# Altium footprint library microbuilder.PCBLIB: 422 footprints (part 19 of 27)
Each footprint in its own frame and in the unit in brackets; x right, y up, seen from the top. Pads: shape width x height; smd on the part's side, far side on the other; paste and mask are expansions set on the pad; w line width, h text height; cw(c..) or ccw(c..) is an arc to the next point about the centre after c.
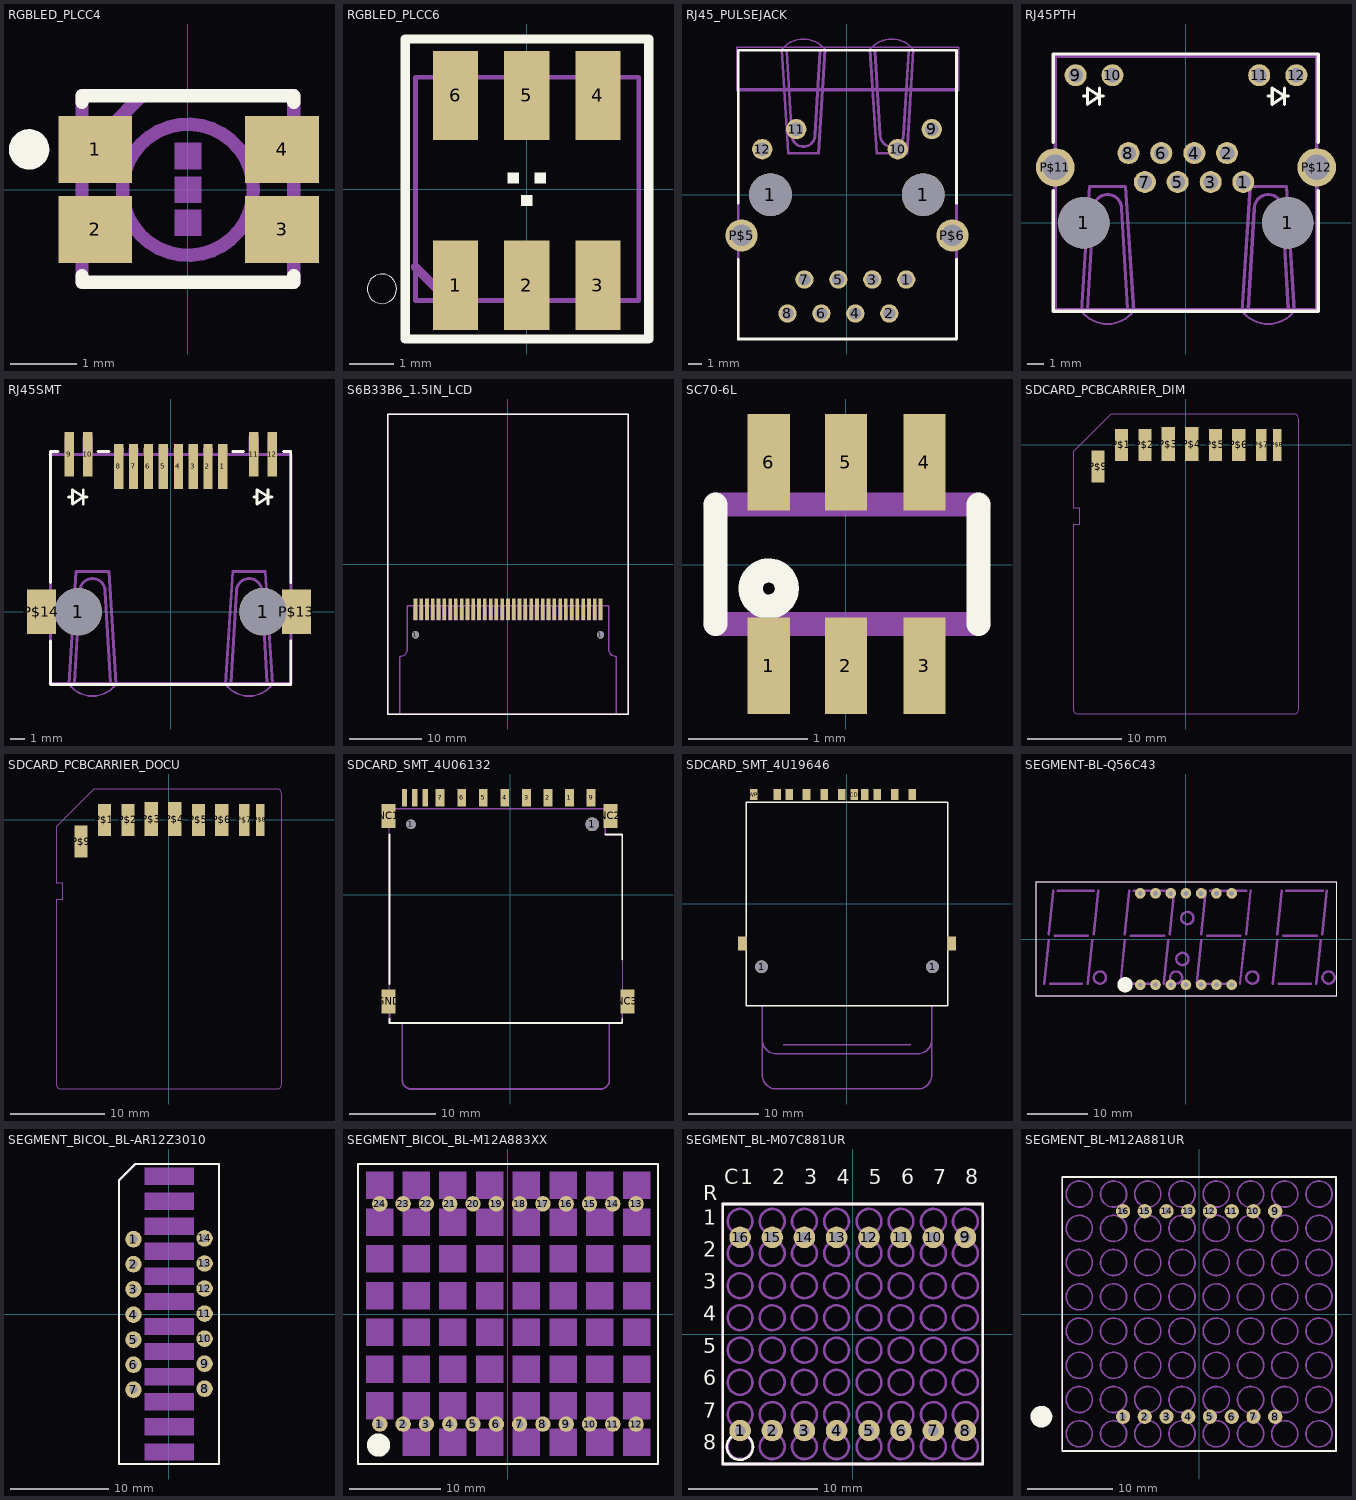
[diagram p18: the footprints below, top view; thin cyan lines are the x and y axes]

## RGBLED_PLCC4 [mil]
pads (4):
  rect 44x40 smd: 1(-55.12,24) 2(-55.12,-23.62) 3(56,-23.62) 4(56,24)
Top Overlay:
  circle w12: c-94.49,24 r6
  lines w8: -62.99,-51.18 -62.99,-55.12 63,-55.12 63,-51.18 ; -62.99,52 -62.99,56 63,56 63,52
Mechanical 16:
  circle w8: c0,0 r39
  rectangle: -7.87,-27.56 8,-11.81
  rectangle: -7.87,-7.87 8,8
  rectangle: -7.87,12 8,28
  lines w5: -62.99,-55.12 63,-55.12 ; -62.99,56 -27.56,56 63,56
  lines w8: -62.99,-55.12 -62.99,20 ; -62.99,56 -62.99,20 ; -27.56,56 -62.99,20 ; 63,-55.12 63,56

## RGBLED_PLCC6 [mil]
pads (6):
  rect 40x79 smd: 1(-62.99,-84.96) 2(0,-84.96) 3(63,-84.96) 4(63,83) 5(0,83) 6(-62.99,83)
Top Overlay:
  circle w0: c-128.11,-88.11 r13
  region: 4.96,-14.8 4.96,-4.88 -4.88,-4.88 -4.88,-14.8
  region: -6.81,5.08 -6.81,14.92 -16.81,14.92 -16.81,5.08
  region: 17,5 17,15 7,15 7,5
  lines w8: -107.5,-132.5 108,-132.5 108,133 -107.5,133 -107.5,-132.5
Top Paste:
  rectangle: 28,-89.57 56,-29.53
  rectangle: -9.84,-89.57 10,-29.53
  rectangle: -55.12,-89.57 -27.56,-29.53
  rectangle: 28,30 56,90
  rectangle: -9.84,30 10,90
  rectangle: -55.12,30 -27.56,90
Top Solder:
  circle w0: c-128.11,-88.11 r13
Mechanical 16:
  lines w4: -98.43,-98.43 -68.9,-98.43 99,-98.43 99,99 -98.43,99 -98.43,-98.43
  lines w8: -98.43,-68.9 -68.9,-98.43

## RJ45_PULSEJACK [mil]
pads (16):
  round 126 hole 126: 1(-225,0) 1(225,0)
  round 54 hole 36: 1(175,-250) 2(125,-350) 3(75,-250) 4(25,-350) 5(-25,-250) 6(-75,-350) 7(-125,-250) 8(-175,-350)
  round 60 hole 40: 9(250,193) 10(150,134) 11(-149.02,193) 12(-249.02,134)
  round 94.5 hole 63: P$5(-310.04,-120.08) P$6(311,-120.08)
Top Overlay:
  lines w8: -320.08,-190.16 -320.08,-425.2 323,-425.2 323,-190.16 ; -320.08,-25.2 -320.08,310 -320.08,425 323,425 323,310 323,-25.2
Mechanical 16:
  lines w5: -320.08,-425.2 323,-425.2 ; -320.08,310 -320.08,425 323,425 323,310 ; -192.05,427 cw(c-128.07,377.79) -64.09,427 ; 68,427 cw(c132,377.77) 196,427
  lines w8: -320.08,-425.2 -320.08,310 323,310 323,-425.2 ; -192.05,427 -172.36,122 -83.78,122 -64.09,427 ; -177.28,422 -162.52,176 ccw(c-128.07,176) -93.62,176 -78.86,422 ; 68,427 88,122 177,122 196,427 ; 83,422 98,176 ccw(c132.5,176) 167,176 182,422
  text "NO TRACE ZONE" at -230,350 h62
Mechanical 27:
  lines w5: -324.65,306 330,306 330,434 -324.65,434 -324.65,306

## RJ45PTH [mil]
pads (16):
  round 126 hole 126: 1(-250,0) 1(250,0)
  round 54 hole 36: 1(141,100) 2(101,171) 3(61,100) 4(21,171) 5(-20.08,100) 6(-60.24,171) 7(-100.39,100) 8(-140.55,171) 9(-270.08,362) 10(-179.92,362) 11(180,362) 12(271,362)
  round 94.5 hole 63: P$11(-320.08,136) P$12(321,136)
Top Overlay:
  lines w8: -324.8,79 -324.8,-216.54 325,-216.54 325,79 ; -324.8,197 -324.8,414 325,414 325,197 ; -250.98,311 -241.14,311 ; -211.61,291 -211.61,311 ; -211.61,330 -211.61,311 ; -201.77,311 -211.61,311 ; 202,311 212,311 ; 242,291 242,311 ; 242,330 242,311 ; 251,311 242,311 ; -241.14,311 -241.14,330 -211.61,311 ; -241.14,311 -241.14,291 -211.61,311 ; 212,311 212,330 242,311 ; 212,311 212,291 242,311
Mechanical 16:
  lines w5: -255.91,-216.54 ccw(c-191.93,-167.32) -127.95,-216.54 ; 138,-216.54 ccw(c202,-167.3) 266,-216.54
  lines w8: -255.91,-216.54 -236.22,89 -147.64,89 -127.95,-216.54 ; -241.14,-211.61 -226.38,35 cw(c-191.93,35) -157.48,35 -142.72,-211.61 ; 138,-216.54 158,89 247,89 266,-216.54 ; 153,-211.61 168,35 cw(c202.5,35) 237,35 251,-211.61 ; -320.08,-212.6 321,-212.6 321,408 -320.08,408 -320.08,-212.6

## RJ45SMT [mil]
pads (16):
  round 128 hole 128: 1(-250,0) 1(250,0)
  rect 25x121 smd: 1(141,393) 2(101,393) 3(61,393) 4(21,393) 5(-20.08,393) 6(-60.24,393) 7(-100.39,393) 8(-140.55,393) 9(-274.61,426) 10(-224.61,426) 11(225,426) 12(275,426)
  rect 79x121 smd: P$13(341,0) P$14(-350,0)
Top Overlay:
  lines w8: -324.8,-78.74 -324.8,-196.85 325,-196.85 325,-78.74 ; -324.8,79 -324.8,434 -305.12,434 ; -275.98,311 -266.14,311 ; -236.61,291 -236.61,311 ; -236.61,330 -236.61,311 ; -226.77,311 -236.61,311 ; -196.85,434 -167.32,434 ; 168,434 197,434 ; 225,311 234,311 ; 264,291 264,311 ; 264,330 264,311 ; 274,311 264,311 ; 306,434 325,434 325,79 ; -266.14,311 -266.14,330 -236.61,311 ; -266.14,311 -266.14,291 -236.61,311 ; 234,311 234,330 264,311 ; 234,311 234,291 264,311
Mechanical 16:
  lines w5: -275.59,-196.85 ccw(c-211.61,-147.64) -147.64,-196.85 ; 148,-196.85 ccw(c212,-147.62) 276,-196.85 ; 215,469 215,471
  lines w8: -329.72,-49.21 -369.09,-49.21 -369.09,50 -324.8,50 ; -325.98,-194.88 326,-194.88 326,426 284,426 ; -325.98,426 -283.46,426 ; -325.79,-194.88 -325.79,426 ; -275.59,-196.85 -255.91,109 -167.32,109 -147.64,-196.85 ; -260.83,-191.93 -246.06,55 cw(c-211.61,55) -177.17,55 -162.4,-191.93 ; -9.84,428 -9.84,441 -29.53,441 -29.53,426 ; 148,-196.85 168,109 256,109 276,-196.85 ; 150,428 150,441 132,441 132,426 ; 163,-191.93 178,55 cw(c212.5,55) 247,55 261,-191.93 ; 235,428 235,473 215,473 215,469 215,426 ; 325,-49.21 365,-49.21 365,50 325,50 ; -283.46,426 -265.75,426 ; -283.46,426 -283.46,473 -265.75,473 -265.75,426 ; -265.75,426 -234.25,426 ; -234.25,426 -214.57,426 ; -234.25,426 -234.25,473 -214.57,473 -214.57,426 ; -214.57,426 -149.61,426 ; -149.61,426 -129.92,426 ; -149.61,426 -149.61,441 -129.92,441 -129.92,426 ; -129.92,426 -110.24,426 ; -110.24,426 -90.55,426 ; -110.24,426 -110.24,441 -90.55,441 -90.55,426 ; -90.55,426 -70.87,426 ; -70.87,426 -51.18,426 ; -70.87,426 -70.87,441 -51.18,441 -51.18,426 ; -51.18,426 -29.53,426 ; -29.53,426 12,426 ; 12,426 30,426 ; 12,426 12,441 30,441 30,426 ; 30,426 52,426 ; 52,426 69,426 ; 52,426 52,441 69,441 69,426 ; 69,426 91,426 ; 91,426 111,426 ; 91,426 91,441 111,441 111,426 ; 111,426 132,426 ; 132,426 215,426 ; 215,426 266,426 ; 266,426 284,426 ; 266,426 266,473 284,473 284,426

## S6B33B6_1.5IN_LCD [mil]
pads (35):
  round 40 hole 40: 1(-503.94,-385.83) 1(504,-385.83)
  rect 20x119 smd: P$1(-503.94,-246.06) P$2(-472.44,-246.06) P$3(-440.94,-246.06) P$4(-409.45,-246.06) P$5(-377.95,-246.06) P$6(-346.46,-246.06) P$7(-314.96,-246.06) P$8(-283.46,-246.06) P$9(-251.97,-246.06) P$10(-220.47,-246.06) P$11(-188.98,-246.06) P$12(-157.48,-246.06) P$13(-125.98,-246.06) P$14(-94.49,-246.06) P$15(-62.99,-246.06) P$16(-31.5,-246.06) P$17(0,-246.06) P$18(32,-246.06) P$19(63,-246.06) P$20(95,-246.06) P$21(126,-246.06) P$22(158,-246.06) P$23(189,-246.06) P$24(221,-246.06) P$25(252,-246.06) P$26(284,-246.06) P$27(315,-246.06) P$28(347,-246.06) P$29(378,-246.06) P$30(410,-246.06) P$31(441,-246.06) P$32(473,-246.06) P$33(504,-246.06)
Top Overlay:
  lines w8: -653.54,-816.93 -653.54,817 654,817 654,-816.93 -653.54,-816.93
Mechanical 16:
  drawing of 310 lines, arcs and shapes, not listed

## SC70-6L [mil]
pads (6):
  rect 14x32 smd: 1(-25.59,-33.46) 2(0,-33.46) 3(26,-33.46) 4(26,34) 5(0,34) 6(-25.59,34)
Top Overlay:
  circle w8: c-25.59,-7.87 r6
  lines w8: -43.31,-19.68 -43.31,20 ; 44,-19.68 44,20
Mechanical 16:
  rectangle: -31.5,-43.31 -19.68,-23.62
  rectangle: -5.91,-43.31 6,-23.62
  rectangle: 20,-43.31 32,-23.62
  rectangle: 20,24 32,44
  rectangle: -5.91,24 6,44
  rectangle: -31.5,24 -19.68,44
  lines w8: -43.31,-19.68 44,-19.68 ; -43.31,20 44,20

## SDCARD_PCBCARRIER_DIM [mil]
pads (9):
  rect 56x134 smd: P$1(-270.67,0) P$2(-172.24,0) P$5(124,0) P$6(222,0) P$9(-369.09,-90.55)
  rect 56x142 smd: P$3(-73.82,4) P$4(25,4)
  rect 44x134 smd: P$7(317,0)
  rect 36x134 smd: P$8(384,0)
Mechanical 1:
  lines w5: -472.44,-1110.24 -472.44,-334.65 -448.82,-334.65 -448.82,-263.78 -472.44,-263.78 -472.44,-27.56 -314.96,130 453,130 cw(c453.5,110.5) 473,111 473,-1110.24 cw(c453.16,-1110.08) 453,-1129.92 -452.76,-1129.92 cw(c-452.76,-1110.24) -472.44,-1110.24
Mechanical 16:
  text "9/DAT2" at -413.39,-187.01 h24.8
  text "CD/DAT3" at -324.8,-98.43 h24.8
  text "CMD" at -196.85,-98.43 h24.8
  text "VSS" at -98.43,-98.43 h24.8
  text "VDD" at 0,-98.43 h24.8
  text "CLK" at 99,-98.43 h24.8
  text "VSS" at 197,-98.43 h24.8
  text "DAT0" at 286,-98.43 h24.8
  text "DAT1" at 365,-98.43 h24.8

## SDCARD_PCBCARRIER_DOCU [mil]
pads (9):
  rect 56x134 smd: P$1(-270.67,0) P$2(-172.24,0) P$5(124,0) P$6(222,0) P$9(-369.09,-90.55)
  rect 56x142 smd: P$3(-73.82,4) P$4(25,4)
  rect 44x134 smd: P$7(317,0)
  rect 36x134 smd: P$8(384,0)
Mechanical 16:
  lines w5: -472.44,-1110.24 -472.44,-334.65 -448.82,-334.65 -448.82,-263.78 -472.44,-263.78 -472.44,-27.56 -314.96,130 453,130 cw(c453.5,110.5) 473,111 473,-1110.24 cw(c453.16,-1110.08) 453,-1129.92 -452.76,-1129.92 cw(c-452.76,-1110.24) -472.44,-1110.24
  text "9/DAT2" at -413.39,-187.01 h24.8
  text "CD/DAT3" at -324.8,-98.43 h24.8
  text "CMD" at -196.85,-98.43 h24.8
  text "VSS" at -98.43,-98.43 h24.8
  text "VDD" at 0,-98.43 h24.8
  text "CLK" at 99,-98.43 h24.8
  text "VSS" at 197,-98.43 h24.8
  text "DAT0" at 286,-98.43 h24.8
  text "DAT1" at 365,-98.43 h24.8

## SDCARD_SMT_4U06132 [mil]
pads (17):
  round 44 hole 44: 1(-452.76,323)
  rect 40x80 smd: 1(271,444) 2(173,444) 3(75,444) 4(-24.41,444) 5(-122.83,444) 6(-221.26,444) 7(-319.69,444) 9(370,444)
  round 63 hole 63: 1(375,323)
  rect 24x80 smd: 8(-387.6,444) CD(-434.84,444) WP(-482.09,444)
  rect 63x111 smd: GND(-555.12,-486.22) NC1(-555.12,361) NC2(458,361) NC3(536,-486.22)
Top Overlay:
  lines w8: -551.18,-564.96 -551.18,-584.65 512,-584.65 512,-564.96 ; -551.18,-407.48 -551.18,276 ; 434,276 512,276 512,-295.28
Mechanical 16:
  lines w5: -551.18,-584.65 -492.13,-584.65 453,-584.65 512,-584.65 ; -551.18,-446.85 -551.18,315 ; 434,276 512,276 512,-446.85
  lines w8: -551.18,-584.65 -551.18,-525.59 ; -492.13,-584.65 -492.13,-846.46 ccw(c-452.76,-846.46) -452.76,-885.83 414,-885.83 ccw(c413.81,-846.64) 453,-846.46 453,-584.65 ; 434,276 434,315 ; 512,-584.65 512,-525.59 ; -551.18,-525.59 -551.18,-446.85 -570.87,-446.85 ccw(c-570.87,-456.69) -580.71,-456.69 -580.71,-515.75 ccw(c-570.87,-515.75) -570.87,-525.59 -551.18,-525.59 ; -551.18,394 -551.18,315 -570.87,315 cw(c-570.79,324.92) -580.71,325 -580.71,384 cw(c-570.79,384.08) -570.87,394 -551.18,394 ; -551.18,394 434,394 ; 434,315 434,394 ; 434,315 453,315 ccw(c453,325) 463,325 463,384 ccw(c453,384) 453,394 434,394 ; 512,-525.59 512,-446.85 542,-446.85 cw(c542.08,-456.77) 552,-456.69 552,-515.75 cw(c542.08,-515.67) 542,-525.59 512,-525.59
  text "SDCARD" at -137.8,-708.66 h77.5
  text "CONFIRM FOOTPRINT!" at -375,-25 h77.5

## SDCARD_SMT_4U19646 [mil]
pads (15):
  round 71 hole 71: 1(-476.38,-350.39) 1(477,-350.39)
  rect 42x62 smd: CD(41,610) P$1(267,610) P$2(169,610) P$3(100,610) P$4(-28.74,610) P$5(-127.17,610) P$6(-225.59,610) P$7(-320.87,610) P$8(-387.8,610) P$9(365,610) WP(-519.68,610)
  rect 48x79 smd: GND@1(583,-220.47) GND@2(-582.68,-220.47)
Top Overlay:
  lines w8: -561.02,-566.93 562,-566.93 562,567 -561.02,567 -561.02,-566.93
Mechanical 16:
  lines w8: -472.44,-763.78 -472.44,-952.76 ccw(c-393.7,-952.76) -393.7,-1031.5 394,-1031.5 ccw(c394.13,-952.63) 473,-952.76 473,-763.78 ; -472.44,-566.93 -472.44,-755.91 ccw(c-393.7,-755.91) -393.7,-834.65 394,-834.65 ccw(c394.13,-755.78) 473,-755.91 473,-566.93 ; -354.33,-783.46 355,-783.46
  text "Push" at -74.8,-767.72 h77.5
  text "Lock" at -66.93,-897.64 h77.5
  text "Dashing" at -125.98,-1003.94 h77.5

## SEGMENT-BL-Q56C43 [mil]
pads (14):
  round 70 hole 32: P$1(-300,-300) P$2(-200,-300) P$3(-100,-300) P$4(0,-300) P$5(100,-300) P$6(200,-300) P$7(300,-300) P$8(300,300) P$9(200,300) P$10(100,300) P$11(0,300) P$12(-100,300) P$13(-200,300) P$14(-300,300)
Top Overlay:
  circle w50: c-400,-300 r25
  lines w8: -984.25,-374.02 -984.25,375 985,375 985,-374.02 -984.25,-374.02
Mechanical 16:
  circle w16: c-564.74,-252.68 r40
  circle w16: c-64.74,-252.68 r40
  circle w16: c436,-252.68 r40
  circle w16: c936,-252.68 r40
  circle w16: c9,138 r40
  circle w16: c-23.41,-130.63 r40
  lines w5: -984.25,-374.02 985,-374.02 985,375 -984.25,375 -984.25,-374.02
  lines w16: -929.68,-292.05 -900.32,-7.09 ; -900.32,33 -870.94,318 ; -890.32,-292.05 -682.2,-292.05 ; -860.94,23 -642.83,23 ; -841.57,318 -603.46,318 ; -645.35,-292.05 -615.98,-7.09 ; -605.98,33 -576.61,318 ; -429.69,-292.05 -400.31,-7.09 ; -400.31,33 -370.94,318 ; -390.31,-292.05 -182.2,-292.05 ; -360.94,23 -142.83,23 ; -341.57,318 -103.46,318 ; -145.35,-292.05 -115.98,-7.09 ; -105.98,33 -76.61,318 ; 71,-292.05 100,-7.09 ; 100,33 130,318 ; 110,-292.05 318,-292.05 ; 140,23 358,23 ; 159,318 397,318 ; 355,-292.05 385,-7.09 ; 395,33 424,318 ; 571,-292.05 600,-7.09 ; 600,33 630,318 ; 610,-292.05 818,-292.05 ; 640,23 858,23 ; 659,318 897,318 ; 855,-292.05 885,-7.09 ; 895,33 924,318
  text "DP" at -599.21,-350.39 h62
  text "A" at -744.88,258 h62
  text "B" at -561.81,158 h62
  text "C" at -595.28,-135.83 h62
  text "D" at -796.06,-263.78 h62
  text "E" at -963.39,-131.89 h62
  text "F" at -933.86,158 h62
  text "G" at -766.54,54 h62
  text "D5" at -10.63,197 h62
  text "D6" at -46.06,-68.9 h62

## SEGMENT_BICOL_BL-AR12Z3010 [mil]
pads (14):
  round 66 hole 32: 1(-141.73,299) 2(-141.73,199) 3(-141.73,99) 4(-141.73,-1.97) 5(-141.73,-101.97) 6(-141.73,-201.97) 7(-141.73,-301.97) 8(142,-298.03) 9(142,-198.03) 10(142,-98.03) 11(142,2) 12(142,102) 13(142,202) 14(142,302)
Top Overlay:
  lines w8: -198.82,-598.43 199,-598.43 199,599 -134.06,599 -198.82,535 -198.82,-598.43
Mechanical 16:
  rectangle: -98.43,16 99,85
  rectangle: -98.43,116 99,185
  rectangle: -98.43,216 99,285
  rectangle: -98.43,316 99,385
  rectangle: -98.43,416 99,485
  rectangle: -98.43,516 99,585
  rectangle: -98.43,-84.25 99,-15.75
  rectangle: -98.43,-184.25 99,-115.75
  rectangle: -98.43,-284.25 99,-215.75
  rectangle: -98.43,-384.25 99,-315.75
  rectangle: -98.43,-484.25 99,-415.75
  rectangle: -98.43,-584.25 99,-515.75
  lines w5: -198.82,-598.43 199,-598.43 199,599
  lines w8: -198.82,-598.43 -198.82,535 -134.06,599 199,599
  text "A" at 225,525 h77.5
  text "B" at 225,425 h77.5
  text "C" at 225,325 h77.5
  text "D" at 225,225 h77.5
  text "E" at 225,125 h77.5
  text "F" at 225,25 h77.5
  text "G" at 225,-75 h77.5
  text "H" at 225,-175 h77.5
  text "I" at 225,-275 h77.5
  text "J" at 225,-375 h77.5
  text "K" at 225,-475 h77.5
  text "L" at 225,-575 h77.5

## SEGMENT_BICOL_BL-M12A883XX [mil]
pads (24):
  round 66 hole 32: 1(-550,-472.44) 2(-450,-472.44) 3(-350,-472.44) 4(-250,-472.44) 5(-150,-472.44) 6(-50,-472.44) 7(50,-472.44) 8(150,-472.44) 9(250,-472.44) 10(350,-472.44) 11(450,-472.44) 12(550,-472.44) 13(550,473) 14(450,473) 15(350,473) 16(250,473) 17(150,473) 18(50,473) 19(-50,473) 20(-150,473) 21(-250,473) 22(-350,473) 23(-450,473) 24(-550,473)
Top Overlay:
  circle w50: c-555.59,-562.44 r25
  lines w8: -643.7,-643.7 644,-643.7 644,644 -643.7,644 -643.7,-643.7
Mechanical 16:
  rectangle: -610.24,493 -492.13,611
  rectangle: -452.76,493 -334.65,611
  rectangle: -295.28,493 -177.17,611
  rectangle: -137.8,493 -19.68,611
  rectangle: 20,493 138,611
  rectangle: 178,493 296,611
  rectangle: 335,493 453,611
  rectangle: 493,493 611,611
  rectangle: 493,335 611,453
  rectangle: 335,335 453,453
  rectangle: 178,335 296,453
  rectangle: 20,335 138,453
  rectangle: -137.8,335 -19.68,453
  rectangle: -295.28,335 -177.17,453
  rectangle: -610.24,335 -492.13,453
  rectangle: -452.76,335 -334.65,453
  rectangle: -610.24,178 -492.13,296
  rectangle: -452.76,178 -334.65,296
  rectangle: -295.28,178 -177.17,296
  rectangle: -137.8,178 -19.68,296
  rectangle: 20,178 138,296
  rectangle: 178,178 296,296
  rectangle: 335,178 453,296
  rectangle: 493,178 611,296
  rectangle: 493,20 611,138
  rectangle: 493,-137.8 611,-19.68
  rectangle: 335,-137.8 453,-19.68
  rectangle: 335,20 453,138
  rectangle: 178,20 296,138
  rectangle: 20,20 138,138
  rectangle: -137.8,20 -19.68,138
  rectangle: -295.28,20 -177.17,138
  rectangle: -452.76,20 -334.65,138
  rectangle: -610.24,20 -492.13,138
  rectangle: -610.24,-137.8 -492.13,-19.68
  rectangle: -452.76,-137.8 -334.65,-19.68
  rectangle: -295.28,-137.8 -177.17,-19.68
  rectangle: -137.8,-137.8 -19.68,-19.68
  rectangle: 20,-137.8 138,-19.68
  rectangle: 178,-137.8 296,-19.68
  rectangle: 493,-295.28 611,-177.17
  rectangle: 335,-295.28 453,-177.17
  rectangle: -610.24,-295.28 -492.13,-177.17
  rectangle: -452.76,-295.28 -334.65,-177.17
  rectangle: -295.28,-295.28 -177.17,-177.17
  rectangle: -137.8,-295.28 -19.68,-177.17
  rectangle: 20,-295.28 138,-177.17
  rectangle: 178,-295.28 296,-177.17
  rectangle: 493,-452.76 611,-334.65
  rectangle: 335,-452.76 453,-334.65
  rectangle: -610.24,-452.76 -492.13,-334.65
  rectangle: -452.76,-452.76 -334.65,-334.65
  rectangle: -295.28,-452.76 -177.17,-334.65
  rectangle: -137.8,-452.76 -19.68,-334.65
  rectangle: 20,-452.76 138,-334.65
  rectangle: 178,-452.76 296,-334.65
  rectangle: 493,-610.24 611,-492.13
  rectangle: 335,-610.24 453,-492.13
  rectangle: -452.76,-610.24 -334.65,-492.13
  rectangle: -295.28,-610.24 -177.17,-492.13
  rectangle: -137.8,-610.24 -19.68,-492.13
  rectangle: 20,-610.24 138,-492.13
  rectangle: 178,-610.24 296,-492.13
  lines w8: -643.7,-643.7 644,-643.7 644,644 -643.7,644 -643.7,-643.7

## SEGMENT_BL-M07C881UR [mil]
pads (16):
  round 66 hole 32: 1(-344.49,-295.28) 2(-246.06,-295.28) 3(-147.64,-295.28) 4(-49.21,-295.28) 5(50,-295.28) 6(148,-295.28) 7(247,-295.28) 8(345,-295.28) 9(345,296) 10(247,296) 11(148,296) 12(50,296) 13(-49.21,296) 14(-147.64,296) 15(-246.06,296) 16(-344.49,296)
Top Overlay:
  circle w8: c-345,-345 r40
  lines w8: -397.64,-397.64 398,-397.64 398,398 -397.64,398 -397.64,-397.64
  text "C" at -393.7,443 h77.5
  text "R" at -457.09,394 h77.5
  text "1" at -344.49,443 h77.5
  text "2" at -246.06,443 h77.5
  text "3" at -147.64,443 h77.5
  text "4" at -49.21,443 h77.5
  text "5" at 50,443 h77.5
  text "6" at 148,443 h77.5
  text "7" at 247,443 h77.5
  text "8" at 345,443 h77.5
  text "1" at -457.09,320 h77.5
  text "2" at -457.09,222 h77.5
  text "3" at -457.09,124 h77.5
  text "4" at -457.09,25 h77.5
  text "5" at -457.09,-73.82 h77.5
  text "6" at -457.09,-172.24 h77.5
  text "7" at -457.09,-270.67 h77.5
  text "8" at -457.09,-369.09 h77.5
Mechanical 16:
  circle w8: c-344.49,345 r38
  circle w8: c-246.06,345 r38
  circle w8: c-147.64,345 r38
  circle w8: c-49.21,345 r38
  circle w8: c50,345 r38
  circle w8: c148,345 r38
  circle w8: c247,345 r38
  circle w8: c345,345 r38
  circle w8: c-344.49,247 r38
  circle w8: c-246.06,247 r38
  circle w8: c-147.64,247 r38
  circle w8: c-49.21,247 r38
  circle w8: c50,247 r38
  circle w8: c148,247 r38
  circle w8: c247,247 r38
  circle w8: c345,247 r38
  circle w8: c-344.49,148 r38
  circle w8: c-246.06,148 r38
  circle w8: c-147.64,148 r38
  circle w8: c-49.21,148 r38
  circle w8: c50,148 r38
  circle w8: c148,148 r38
  circle w8: c247,148 r38
  circle w8: c345,148 r38
  circle w8: c-344.49,50 r38
  circle w8: c-246.06,50 r38
  circle w8: c-147.64,50 r38
  circle w8: c-49.21,50 r38
  circle w8: c50,50 r38
  circle w8: c148,50 r38
  circle w8: c247,50 r38
  circle w8: c345,50 r38
  circle w8: c-344.49,-49.21 r38
  circle w8: c-246.06,-49.21 r38
  circle w8: c-147.64,-49.21 r38
  circle w8: c-49.21,-49.21 r38
  circle w8: c50,-49.21 r38
  circle w8: c148,-49.21 r38
  circle w8: c247,-49.21 r38
  circle w8: c345,-49.21 r38
  circle w8: c-344.49,-147.64 r38
  circle w8: c-246.06,-147.64 r38
  circle w8: c-147.64,-147.64 r38
  circle w8: c-49.21,-147.64 r38
  circle w8: c50,-147.64 r38
  circle w8: c148,-147.64 r38
  circle w8: c247,-147.64 r38
  circle w8: c345,-147.64 r38
  circle w8: c-344.49,-246.06 r38
  circle w8: c-246.06,-246.06 r38
  circle w8: c-147.64,-246.06 r38
  circle w8: c-49.21,-246.06 r38
  circle w8: c50,-246.06 r38
  circle w8: c148,-246.06 r38
  circle w8: c247,-246.06 r38
  circle w8: c345,-246.06 r38
  circle w8: c-344.49,-344.49 r38
  circle w8: c-246.06,-344.49 r38
  circle w8: c-147.64,-344.49 r38
  circle w8: c-49.21,-344.49 r38
  circle w8: c50,-344.49 r38
  circle w8: c148,-344.49 r38
  circle w8: c247,-344.49 r38
  circle w8: c345,-344.49 r38
  lines w8: -397.64,-397.64 398,-397.64 398,398 -397.64,398 -397.64,-397.64

## SEGMENT_BL-M12A881UR [mil]
pads (16):
  round 66 hole 32: 1(-350,-472.44) 2(-250,-472.44) 3(-150,-472.44) 4(-50,-472.44) 5(50,-472.44) 6(150,-472.44) 7(250,-472.44) 8(350,-472.44) 9(350,473) 10(250,473) 11(150,473) 12(50,473) 13(-50,473) 14(-150,473) 15(-250,473) 16(-350,473)
Top Overlay:
  circle w50: c-725.59,-472.44 r25
  lines w8: -629.92,-629.92 630,-629.92 630,630 -629.92,630 -629.92,-629.92
Mechanical 16:
  circle w8: c-551.18,552 r60
  circle w8: c-393.7,552 r60
  circle w8: c-236.22,552 r60
  circle w8: c-78.74,552 r60
  circle w8: c79,552 r60
  circle w8: c237,552 r60
  circle w8: c394,552 r60
  circle w8: c552,552 r60
  circle w8: c-551.18,394 r60
  circle w8: c-393.7,394 r60
  circle w8: c-236.22,394 r60
  circle w8: c-78.74,394 r60
  circle w8: c79,394 r60
  circle w8: c237,394 r60
  circle w8: c394,394 r60
  circle w8: c552,394 r60
  circle w8: c-551.18,237 r60
  circle w8: c-393.7,237 r60
  circle w8: c-236.22,237 r60
  circle w8: c-78.74,237 r60
  circle w8: c79,237 r60
  circle w8: c237,237 r60
  circle w8: c394,237 r60
  circle w8: c552,237 r60
  circle w8: c-551.18,79 r60
  circle w8: c-393.7,79 r60
  circle w8: c-236.22,79 r60
  circle w8: c-78.74,79 r60
  circle w8: c79,79 r60
  circle w8: c237,79 r60
  circle w8: c394,79 r60
  circle w8: c552,79 r60
  circle w8: c-551.18,-78.74 r60
  circle w8: c-393.7,-78.74 r60
  circle w8: c-236.22,-78.74 r60
  circle w8: c-78.74,-78.74 r60
  circle w8: c79,-78.74 r60
  circle w8: c237,-78.74 r60
  circle w8: c394,-78.74 r60
  circle w8: c552,-78.74 r60
  circle w8: c-551.18,-236.22 r60
  circle w8: c-393.7,-236.22 r60
  circle w8: c-236.22,-236.22 r60
  circle w8: c-78.74,-236.22 r60
  circle w8: c79,-236.22 r60
  circle w8: c237,-236.22 r60
  circle w8: c394,-236.22 r60
  circle w8: c552,-236.22 r60
  circle w8: c-551.18,-393.7 r60
  circle w8: c-393.7,-393.7 r60
  circle w8: c-236.22,-393.7 r60
  circle w8: c-78.74,-393.7 r60
  circle w8: c79,-393.7 r60
  circle w8: c237,-393.7 r60
  circle w8: c394,-393.7 r60
  circle w8: c552,-393.7 r60
  circle w8: c-551.18,-551.18 r60
  circle w8: c-393.7,-551.18 r60
  circle w8: c-236.22,-551.18 r60
  circle w8: c-78.74,-551.18 r60
  circle w8: c79,-551.18 r60
  circle w8: c237,-551.18 r60
  circle w8: c394,-551.18 r60
  circle w8: c552,-551.18 r60
  lines w8: -629.92,-629.92 630,-629.92 630,630 -629.92,630 -629.92,-629.92